# Altium footprint library Connectors THD.PcbLib: 631 footprints (part 44 of 46)
Each footprint in its own frame and in the unit in brackets; x right, y up, seen from the top. Pads: shape width x height; smd on the part's side, far side on the other; paste and mask are expansions set on the pad; w line width, h text height; cw(c..) or ccw(c..) is an arc to the next point about the centre after c.
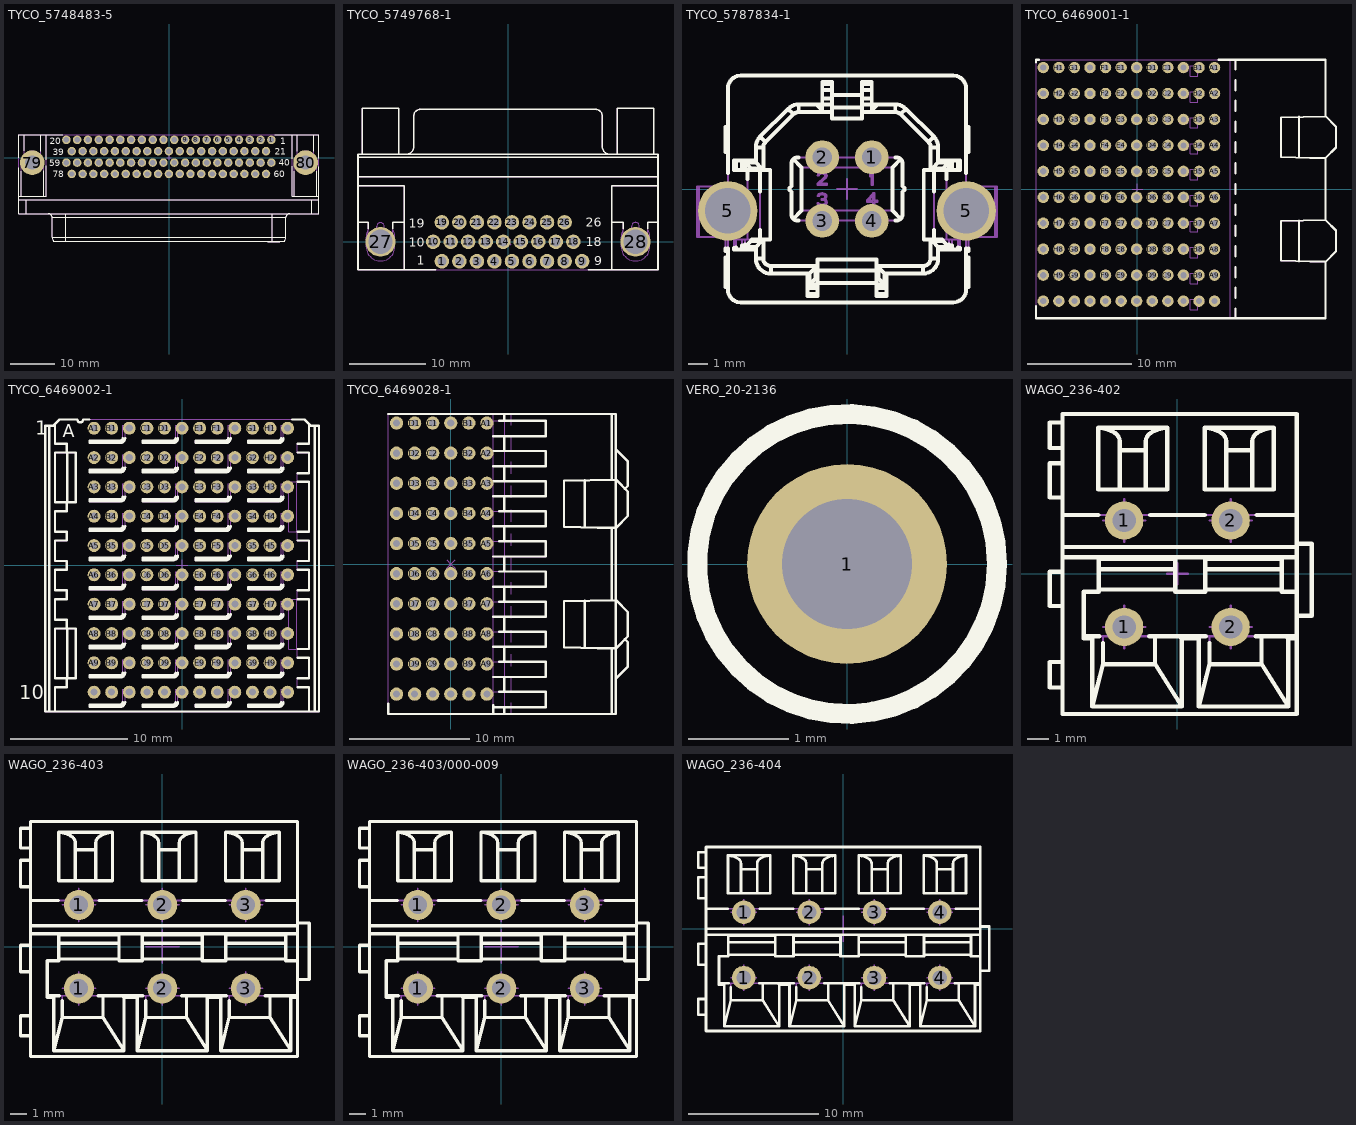
[diagram p43: the footprints below, top view; thin cyan lines are the x and y axes]

## TYCO_5748483-5 [mm] "Right Angle D-SUB 78 Female Contacts, Shell Size 5, With Boardlock and Threaded Insert,(4-40 UNC), HD-22 Serie"
height 15.55
pads (80):
  round 1.9 hole 1.2: 1(22.87,3.965) 2(20.46,3.965) 3(18.05,3.965) 4(15.64,3.965) 5(13.23,3.965) 6(10.82,3.965) 7(8.41,3.965) 8(6,3.965) 9(3.59,3.965) 10(1.18,3.965) 11(-1.23,3.965) 12(-3.64,3.965) 13(-6.05,3.965) 14(-8.46,3.965) 15(-10.87,3.965) 16(-13.28,3.965) 17(-15.69,3.965) 18(-18.1,3.965) 19(-20.51,3.965) 20(-22.92,3.965) 21(21.67,1.425) 22(19.26,1.425) 23(16.85,1.425) 24(14.44,1.425) 25(12.03,1.425) 26(9.62,1.425) 27(7.21,1.425) 28(4.8,1.425) 29(2.39,1.425) 30(-0.02,1.425) 31(-2.43,1.425) 32(-4.84,1.425) 33(-7.25,1.425) 34(-9.66,1.425) 35(-12.07,1.425) 36(-14.48,1.425) 37(-16.89,1.425) 38(-19.3,1.425) 39(-21.71,1.425) 40(22.87,-1.115) 41(20.46,-1.115) 42(18.05,-1.115) 43(15.64,-1.115) 44(13.23,-1.115) 45(10.82,-1.115) 46(8.41,-1.115) 47(6,-1.115) 48(3.59,-1.115) 49(1.18,-1.115) 50(-1.23,-1.115) 51(-3.64,-1.115) 52(-6.05,-1.115) 53(-8.46,-1.115) 54(-10.87,-1.115) 55(-13.28,-1.115) 56(-15.69,-1.115) 57(-18.1,-1.115) 58(-20.51,-1.115) 59(-22.92,-1.115) 60(21.67,-3.655) 61(19.26,-3.655) 62(16.85,-3.655) 63(14.44,-3.655) 64(12.03,-3.655) 65(9.62,-3.655) 66(7.21,-3.655) 67(4.8,-3.655) 68(2.39,-3.655) 69(-0.02,-3.655) 70(-2.43,-3.655) 71(-4.84,-3.655) 72(-7.25,-3.655) 73(-9.66,-3.655) 74(-12.07,-3.655) 75(-14.48,-3.655) 76(-16.89,-3.655) 77(-19.3,-3.655) 78(-21.71,-3.655)
  round 5.5 hole 3.2: 79(-30.55,-1.115) 80(30.5,-1.115)
Top Overlay:
  lines w0.2: -33.5,-9.405 33.5,-9.405 ; -33.5,-8.645 -27.47,-8.645 -27.47,-1.775 ; -33.5,-2.22 -33.5,-12.545 33.5,-12.545 33.5,-2.075 ; -33.5,-0.01 -33.5,5.055 -23.717,5.055 ; -33,-8.645 -33,-3.095 ; -32.325,1.487 -32.325,5.055 ; -31.925,-12.545 -31.925,-9.405 ; -28.675,1.416 -28.675,5.055 ; -28,-8.645 -28,-2.964 ; -27.47,-0.455 -27.47,5.055 ; -26.913,-12.545 cw(c-26.913,-13.358) -26.1,-13.358 ; -23.052,-18.645 -23.052,-12.545 ; 22,-18.645 22,-18.745 22.75,-18.745 22.75,-18.645 ; 22.021,-18.745 22.021,-18.645 ; 22.063,-18.745 22.063,-18.645 ; 22.125,-18.745 22.125,-18.645 ; 22.229,-18.745 22.229,-18.645 ; 22.333,-18.745 22.333,-18.645 ; 22.417,-18.745 22.417,-18.645 ; 22.521,-18.745 22.521,-18.645 ; 22.625,-18.745 22.625,-18.645 ; 22.688,-18.745 22.688,-18.645 ; 22.708,-18.745 22.708,-18.645 ; 22.8,-18.645 22.8,-18.745 23.967,-18.745 23.967,-18.645 ; 22.821,-18.745 22.821,-18.645 ; 22.842,-18.745 22.842,-18.645 ; 22.925,-18.745 22.925,-18.645 ; 23.008,-18.745 23.008,-18.645 ; 23.052,-18.645 23.052,-12.545 ; 23.154,-18.745 23.154,-18.645 ; 23.238,-18.745 23.238,-18.645 ; 23.363,-18.745 23.363,-18.645 ; 23.446,-18.745 23.446,-18.645 ; 23.529,-18.745 23.529,-18.645 ; 23.55,-18.745 23.55,-18.645 ; 23.625,-18.745 23.625,-18.645 ; 23.667,5.055 33.5,5.055 33.5,-0.155 ; 23.717,-18.745 23.717,-18.645 ; 23.842,-18.745 23.842,-18.645 ; 24,-18.645 24,-18.745 24.75,-18.745 24.75,-18.645 ; 24.021,-18.745 24.021,-18.645 ; 24.042,-18.745 24.042,-18.645 ; 24.083,-18.745 24.083,-18.645 ; 24.1,-18.745 24.1,-18.645 ; 24.225,-18.745 24.225,-18.645 ; 24.35,-18.745 24.35,-18.645 ; 24.375,-18.745 24.375,-18.645 ; 24.5,-18.745 24.5,-18.645 ; 24.604,-18.745 24.604,-18.645 ; 24.667,-18.745 24.667,-18.645 ; 24.708,-18.745 24.708,-18.645 ; 24.729,-18.745 24.729,-18.645 ; 26.913,-12.545 ccw(c26.913,-13.358) 26.1,-13.358 ; 27.47,-1.976 27.47,-8.645 33.5,-8.645 ; 27.47,-0.254 27.47,5.055 ; 28,-8.645 28,-3.031 ; 28.675,1.452 28.675,5.055 ; 31.925,-12.545 31.925,-9.405 ; 32.325,1.452 32.325,5.055 ; 33,-8.645 33,-3.031 ; -26.1,-17.82 ccw(c-24.83,-17.82) -25.795,-18.645 25.795,-18.645 ccw(c24.83,-17.82) 26.1,-17.82 ; -26.1,-17.82 -26.1,-13.358 ; -26.1,-17.82 26.1,-17.82 ; -26.1,-13.358 26.1,-13.358 ; 26.1,-17.82 26.1,-13.358
  text "60" at 23.446,-4.402 h1.5
  text "40" at 24.471,-1.827 h1.5
  text "21" at 23.596,0.623 h1.5
  text "59" at -26.733,-1.94 h1.5
  text "39" at -25.979,0.56 h1.5
  text "1" at 24.846,2.963 h1.5
  text "78" at -25.954,-4.44 h1.5
  text "20" at -26.629,2.923 h1.5
Mechanical 8:
  drawing of 168 lines, arcs and shapes, not listed
Mechanical 14:
  lines w0.1: -33.5,-9.405 33.5,-9.405 ; -33.5,-8.645 -27.47,-8.645 -27.47,5.055 ; -33,-8.645 -33,-1.115 -31.5,-1.115 -31.5,-0.815 ; -32.325,-1.115 -32.325,5.055 ; -32.325,-0.39 cw(c-30.5,-0.39) -28.675,-0.39 ; -32.155,-1.115 -32.155,-0.815 -30.775,-0.815 -30.775,-1.115 -30.225,-1.115 -30.225,-0.815 -28.845,-0.815 -28.845,-1.115 ; -31.925,-12.545 -31.925,-9.405 ; -31.764,-1.115 -31.764,-0.815 ; -31.68,-1.115 -31.68,-0.815 ; -29.5,-0.815 -29.5,-1.115 -28,-1.115 -28,-8.645 ; -29.32,-1.115 -29.32,-0.815 ; -29.236,-1.115 -29.236,-0.815 ; -28.675,-1.115 -28.675,5.055 ; -26.913,-12.545 cw(c-26.913,-13.358) -26.1,-13.358 ; -23.052,-18.645 -23.052,-12.545 ; 22,-18.645 22,-18.745 22.75,-18.745 22.75,-18.645 ; 22.021,-18.745 22.021,-18.645 ; 22.063,-18.745 22.063,-18.645 ; 22.125,-18.745 22.125,-18.645 ; 22.229,-18.745 22.229,-18.645 ; 22.333,-18.745 22.333,-18.645 ; 22.417,-18.745 22.417,-18.645 ; 22.521,-18.745 22.521,-18.645 ; 22.625,-18.745 22.625,-18.645 ; 22.688,-18.745 22.688,-18.645 ; 22.708,-18.745 22.708,-18.645 ; 22.8,-18.645 22.8,-18.745 23.967,-18.745 23.967,-18.645 ; 22.821,-18.745 22.821,-18.645 ; 22.842,-18.745 22.842,-18.645 ; 22.925,-18.745 22.925,-18.645 ; 23.008,-18.745 23.008,-18.645 ; 23.052,-18.645 23.052,-12.545 ; 23.154,-18.745 23.154,-18.645 ; 23.238,-18.745 23.238,-18.645 ; 23.363,-18.745 23.363,-18.645 ; 23.446,-18.745 23.446,-18.645 ; 23.529,-18.745 23.529,-18.645 ; 23.55,-18.745 23.55,-18.645 ; 23.625,-18.745 23.625,-18.645 ; 23.717,-18.745 23.717,-18.645 ; 23.842,-18.745 23.842,-18.645 ; 24,-18.645 24,-18.745 24.75,-18.745 24.75,-18.645 ; 24.021,-18.745 24.021,-18.645 ; 24.042,-18.745 24.042,-18.645 ; 24.083,-18.745 24.083,-18.645 ; 24.1,-18.745 24.1,-18.645 ; 24.225,-18.745 24.225,-18.645 ; 24.35,-18.745 24.35,-18.645 ; 24.375,-18.745 24.375,-18.645 ; 24.5,-18.745 24.5,-18.645 ; 24.604,-18.745 24.604,-18.645 ; 24.667,-18.745 24.667,-18.645 ; 24.708,-18.745 24.708,-18.645 ; 24.729,-18.745 24.729,-18.645 ; 26.913,-12.545 ccw(c26.913,-13.358) 26.1,-13.358 ; 27.47,5.055 27.47,-8.645 33.5,-8.645 ; 28,-8.645 28,-1.115 29.5,-1.115 29.5,-0.815 ; 28.675,-1.115 28.675,5.055 ; 28.675,-0.39 cw(c30.5,-0.39) 32.325,-0.39 ; 28.845,-1.115 28.845,-0.815 30.225,-0.815 30.225,-1.115 30.775,-1.115 30.775,-0.815 32.155,-0.815 32.155,-1.115 ; 29.236,-1.115 29.236,-0.815 ; 29.32,-1.115 29.32,-0.815 ; 31.5,-0.815 31.5,-1.115 33,-1.115 33,-8.645 ; 31.68,-1.115 31.68,-0.815 ; 31.764,-1.115 31.764,-0.815 ; 31.925,-12.545 31.925,-9.405 ; 32.325,-1.115 32.325,5.055 ; -26.1,-17.82 ccw(c-24.83,-17.82) -25.795,-18.645 25.795,-18.645 ccw(c24.83,-17.82) 26.1,-17.82 ; -26.1,-17.82 -26.1,-13.358 ; -26.1,-17.82 26.1,-17.82 ; -26.1,-13.358 26.1,-13.358 ; 26.1,-17.82 26.1,-13.358 ; -33.5,-12.545 -33.5,5.055 33.5,5.055 33.5,-12.545 -33.5,-12.545
  text "60" at 23.446,-4.402 h1.5
  text "40" at 24.471,-1.827 h1.5
  text "21" at 23.596,0.623 h1.5
  text "59" at -26.733,-1.94 h1.5
  text "39" at -25.979,0.56 h1.5
  text "1" at 24.846,2.963 h1.5
  text "78" at -25.954,-4.44 h1.5
  text "20" at -26.629,2.923 h1.5
3D body: height 15.3, standoff -3.5, extent -33.5,-18.745 33.5,5.055

## TYCO_5749768-1 [mm] "26 Female Contacts, Right Angle High Density D-SUB Connector With Boardlock and 4-40 UNC Female Screwlocks, AMPLIMITE HD-22 Serie"
height 12.75
pads (28):
  round 1.9 hole 1.2: 1(-8.64,-2.54) 2(-6.35,-2.54) 3(-4.06,-2.54) 4(-1.77,-2.54) 5(0.52,-2.54) 6(2.81,-2.54) 7(5.1,-2.54) 8(7.39,-2.54) 9(9.68,-2.54) 10(-9.78,0) 11(-7.49,0) 12(-5.2,0) 13(-2.91,0) 14(-0.62,0) 15(1.67,0) 16(3.96,0) 17(6.25,0) 18(8.54,0) 19(-8.64,2.54) 20(-6.35,2.54) 21(-4.06,2.54) 22(-1.77,2.54) 23(0.52,2.54) 24(2.81,2.54) 25(5.1,2.54) 26(7.39,2.54)
  round 3.9 hole 3.2: 27(-16.66,0) 28(16.66,0)
Top Overlay:
  lines w0.2: -19.6,2.53 -18.285,2.53 -18.285,1.698 ; -19.6,7.33 -13.55,7.33 -13.55,-3.63 ; -19.6,8.53 19.6,8.53 ; -19.6,11.03 19.6,11.03 ; -19.06,11.43 -19.06,17.43 -14.26,17.43 -14.26,11.43 ; -15.035,1.698 -15.035,2.53 -13.55,2.53 ; -13.32,11.43 ccw(c-13.32,12.43) -12.32,12.43 -12.32,16.45 cw(c-11.47,16.45) -11.47,17.3 11.47,17.3 cw(c11.47,16.45) 12.32,16.45 12.32,12.43 ccw(c13.32,12.43) 13.32,11.43 ; -9.436,-3.63 -19.6,-3.63 -19.6,11.43 19.6,11.43 19.6,-3.63 10.476,-3.63 ; 13.55,-3.63 13.55,7.33 19.6,7.33 ; 13.55,2.53 15.035,2.53 15.035,1.698 ; 14.26,11.43 14.26,17.43 19.06,17.43 19.06,11.43 ; 18.285,1.698 18.285,2.53 19.6,2.53
  text "1" at -11.95,-3 h1.2
  text "19" at -12.95,1.865 h1.2
  text "10" at -12.95,-0.675 h1.2
  text "18" at 10.175,-0.6 h1.2
  text "26" at 10.175,1.94 h1.2
  text "9" at 11.25,-3.04 h1.2
Mechanical 8:
  lines w0.1: -17.16,0 -16.66,0 ; -16.66,-0.5 -16.66,0 ; -16.66,0.5 -16.66,0 ; -16.16,0 -16.66,0 ; -10.28,0 -9.78,0 ; -9.78,-0.5 -9.78,0 ; -9.78,0.5 -9.78,0 ; -9.28,0 -9.78,0 ; -9.14,-2.54 -8.64,-2.54 ; -9.14,2.54 -8.64,2.54 ; -8.64,-3.04 -8.64,-2.54 ; -8.64,-2.04 -8.64,-2.54 ; -8.64,2.04 -8.64,2.54 ; -8.64,3.04 -8.64,2.54 ; -8.14,-2.54 -8.64,-2.54 ; -8.14,2.54 -8.64,2.54 ; -7.99,0 -7.49,0 ; -7.49,-0.5 -7.49,0 ; -7.49,0.5 -7.49,0 ; -6.99,0 -7.49,0 ; -6.85,-2.54 -6.35,-2.54 ; -6.85,2.54 -6.35,2.54 ; -6.35,-3.04 -6.35,-2.54 ; -6.35,-2.04 -6.35,-2.54 ; -6.35,2.04 -6.35,2.54 ; -6.35,3.04 -6.35,2.54 ; -5.85,-2.54 -6.35,-2.54 ; -5.85,2.54 -6.35,2.54 ; -5.7,0 -5.2,0 ; -5.2,-0.5 -5.2,0 ; -5.2,0.5 -5.2,0 ; -4.7,0 -5.2,0 ; -4.56,-2.54 -4.06,-2.54 ; -4.56,2.54 -4.06,2.54 ; -4.06,-3.04 -4.06,-2.54 ; -4.06,-2.04 -4.06,-2.54 ; -4.06,2.04 -4.06,2.54 ; -4.06,3.04 -4.06,2.54 ; -3.56,-2.54 -4.06,-2.54 ; -3.56,2.54 -4.06,2.54 ; -3.41,0 -2.91,0 ; -2.91,-0.5 -2.91,0 ; -2.91,0.5 -2.91,0 ; -2.41,0 -2.91,0 ; -2.27,-2.54 -1.77,-2.54 ; -2.27,2.54 -1.77,2.54 ; -1.77,-3.04 -1.77,-2.54 ; -1.77,-2.04 -1.77,-2.54 ; -1.77,2.04 -1.77,2.54 ; -1.77,3.04 -1.77,2.54 ; -1.27,-2.54 -1.77,-2.54 ; -1.27,2.54 -1.77,2.54 ; -1.12,0 -0.62,0 ; -0.62,-0.5 -0.62,0 ; -0.62,0.5 -0.62,0 ; -0.354,-0.354 0,0 ; -0.354,0.354 0,0 ; 0.02,-2.54 0.52,-2.54 ; 0.02,2.54 0.52,2.54 ; 0.354,-0.354 0,0 ; 0.354,0.354 0,0 ; 0.52,-3.04 0.52,-2.54 ; 0.52,-2.04 0.52,-2.54 ; 0.52,2.04 0.52,2.54 ; 0.52,3.04 0.52,2.54 ; 1.02,-2.54 0.52,-2.54 ; 1.02,2.54 0.52,2.54 ; 1.17,0 1.67,0 ; 1.67,-0.5 1.67,0 ; 1.67,0.5 1.67,0 ; 2.17,0 1.67,0 ; 2.31,-2.54 2.81,-2.54 ; 2.31,2.54 2.81,2.54 ; 2.81,-3.04 2.81,-2.54 ; 2.81,-2.04 2.81,-2.54 ; 2.81,2.04 2.81,2.54 ; 2.81,3.04 2.81,2.54 ; 3.31,-2.54 2.81,-2.54 ; 3.31,2.54 2.81,2.54 ; 3.46,0 3.96,0 ; 3.96,-0.5 3.96,0 ; 3.96,0.5 3.96,0 ; 4.46,0 3.96,0 ; 4.6,-2.54 5.1,-2.54 ; 4.6,2.54 5.1,2.54 ; 5.1,-3.04 5.1,-2.54 ; 5.1,-2.04 5.1,-2.54 ; 5.1,2.04 5.1,2.54 ; 5.1,3.04 5.1,2.54 ; 5.6,-2.54 5.1,-2.54 ; 5.6,2.54 5.1,2.54 ; 5.75,0 6.25,0 ; 6.25,-0.5 6.25,0 ; 6.25,0.5 6.25,0 ; 6.75,0 6.25,0 ; 6.89,-2.54 7.39,-2.54 ; 6.89,2.54 7.39,2.54 ; 7.39,-3.04 7.39,-2.54 ; 7.39,-2.04 7.39,-2.54 ; 7.39,2.04 7.39,2.54 ; 7.39,3.04 7.39,2.54 ; 7.89,-2.54 7.39,-2.54 ; 7.89,2.54 7.39,2.54 ; 8.04,0 8.54,0 ; 8.54,-0.5 8.54,0 ; 8.54,0.5 8.54,0 ; 9.04,0 8.54,0 ; 9.18,-2.54 9.68,-2.54 ; 9.68,-3.04 9.68,-2.54 ; 9.68,-2.04 9.68,-2.54 ; 10.18,-2.54 9.68,-2.54 ; 16.16,0 16.66,0 ; 16.66,-0.5 16.66,0 ; 16.66,0.5 16.66,0 ; 17.16,0 16.66,0
Mechanical 14:
  lines w0.1: -19.6,2.53 -18.285,2.53 -18.285,-0.3 ; -19.6,7.33 -13.55,7.33 -13.55,-3.63 ; -19.6,8.53 19.6,8.53 ; -19.6,11.03 19.6,11.03 ; -19.06,11.43 -19.06,17.43 -14.26,17.43 -14.26,11.43 ; -18.285,0.3 -18.535,0.3 -18.535,0.625 cw(c-16.66,0.625) -18.285,1.56 ; -17.16,2.03 -17.16,-0.3 -18.285,-0.3 ; -17.154,1.951 cw(c-16.658,2.001) -16.16,2.03 -16.16,-0.3 -15.035,-0.3 ; -15.035,0.3 -14.785,0.3 -14.785,0.625 ccw(c-16.66,0.625) -15.035,1.56 ; -13.55,2.53 -15.035,2.53 -15.035,-0.3 ; -13.32,11.43 ccw(c-13.32,12.43) -12.32,12.43 -12.32,16.45 cw(c-11.47,16.45) -11.47,17.3 11.47,17.3 cw(c11.47,16.45) 12.32,16.45 12.32,12.43 ccw(c13.32,12.43) 13.32,11.43 ; 13.55,-3.63 13.55,7.33 19.6,7.33 ; 13.55,2.53 15.035,2.53 15.035,-0.3 ; 14.26,11.43 14.26,17.43 19.06,17.43 19.06,11.43 ; 15.035,0.3 14.785,0.3 14.785,0.625 cw(c16.66,0.625) 15.035,1.56 ; 18.285,0.3 18.535,0.3 18.535,0.625 ccw(c16.66,0.625) 18.285,1.56 ; 19.6,2.53 18.285,2.53 18.285,-0.3 ; -18.285,-0.3 -18.535,-0.3 -18.535,-0.625 ccw(c-16.66,-0.625) -14.785,-0.625 -14.785,-0.3 -15.035,-0.3 ; 15.035,-0.3 14.785,-0.3 14.785,-0.625 ccw(c16.66,-0.625) 18.535,-0.625 18.535,-0.3 18.285,-0.3 ; 15.035,-0.3 16.16,-0.3 16.16,2.03 cw(c16.66,2.03) 17.16,2.03 17.16,-0.3 18.285,-0.3 ; -19.6,-3.63 -19.6,11.43 19.6,11.43 19.6,-3.63 -19.6,-3.63
3D body: height 12.5, standoff -4.35, extent -19.6,-3.63 19.6,17.43

## TYCO_5787834-1 [mm] "4 Position, Straight USB Type B Receptacle"
height 15.62
pads (6):
  round 1.7 hole 1: 1(1.25,1.605) 2(-1.25,1.605) 3(-1.25,-1.605) 4(1.25,-1.605)
  round 3 hole 2.3: 5(-6.02,-1.1) 5(6.02,-1.1)
Top Overlay:
  drawing of 188 lines, arcs and shapes, not listed
Mechanical 8:
  lines w0.1: -6.52,-1.1 -6.02,-1.1 ; -6.02,-1.6 -6.02,-1.1 ; -6.02,-0.6 -6.02,-1.1 ; -5.52,-1.1 -6.02,-1.1 ; -1.75,-1.605 -1.25,-1.605 ; -1.75,1.605 -1.25,1.605 ; -1.25,-2.105 -1.25,-1.605 ; -1.25,-1.105 -1.25,-1.605 ; -1.25,1.105 -1.25,1.605 ; -1.25,2.105 -1.25,1.605 ; -0.75,-1.605 -1.25,-1.605 ; -0.75,1.605 -1.25,1.605 ; -0.5,0 0,0 ; 0,-0.5 0,0 ; 0,0.5 0,0 ; 0.5,0 0,0 ; 0.75,-1.605 1.25,-1.605 ; 0.75,1.605 1.25,1.605 ; 1.25,-2.105 1.25,-1.605 ; 1.25,-1.105 1.25,-1.605 ; 1.25,1.105 1.25,1.605 ; 1.25,2.105 1.25,1.605 ; 1.75,-1.605 1.25,-1.605 ; 1.75,1.605 1.25,1.605 ; 5.52,-1.1 6.02,-1.1 ; 6.02,-1.6 6.02,-1.1 ; 6.02,-0.6 6.02,-1.1 ; 6.52,-1.1 6.02,-1.1
Mechanical 14:
  drawing of 314 lines, arcs and shapes, not listed
3D body: height 15.62, standoff -4.02, extent -7.571,-5.723 7.572,5.733

## TYCO_6469001-1 [mm] "80 Positions, Pitch 2.5mm,  Advanced TCA, Z-PACK HM-Zd Right Angle Press Fit Receptacle"
height 15.72
pads (120):
  round 1.1 hole 0.6: A1(7.435,11.7) A2(7.435,9.2) A3(7.435,6.7) A4(7.435,4.2) A5(7.435,1.7) A6(7.435,-0.8) A7(7.435,-3.3) A8(7.435,-5.8) A9(7.435,-8.3) A10(7.435,-10.8) B1(5.935,11.7) B2(5.935,9.2) B3(5.935,6.7) B4(5.935,4.2) B5(5.935,1.7) B6(5.935,-0.8) B7(5.935,-3.3) B8(5.935,-5.8) B9(5.935,-8.3) B10(5.935,-10.8) BG1(4.435,11.7) BG2(4.435,9.2) BG3(4.435,6.7) BG4(4.435,4.2) BG5(4.435,1.7) BG6(4.435,-0.8) BG7(4.435,-3.3) BG8(4.435,-5.8) BG9(4.435,-8.3) BG10(4.435,-10.8) C1(2.935,11.7) C2(2.935,9.2) C3(2.935,6.7) C4(2.935,4.2) C5(2.935,1.7) C6(2.935,-0.8) C7(2.935,-3.3) C8(2.935,-5.8) C9(2.935,-8.3) C10(2.935,-10.8) D1(1.435,11.7) D2(1.435,9.2) D3(1.435,6.7) D4(1.435,4.2) D5(1.435,1.7) D6(1.435,-0.8) D7(1.435,-3.3) D8(1.435,-5.8) D9(1.435,-8.3) D10(1.435,-10.8) DG1(-0.065,11.7) DG2(-0.065,9.2) DG3(-0.065,6.7) DG4(-0.065,4.2) DG5(-0.065,1.7) DG6(-0.065,-0.8) DG7(-0.065,-3.3) DG8(-0.065,-5.8) DG9(-0.065,-8.3) DG10(-0.065,-10.8) E1(-1.565,11.7) E2(-1.565,9.2) E3(-1.565,6.7) E4(-1.565,4.2) E5(-1.565,1.7) E6(-1.565,-0.8) E7(-1.565,-3.3) E8(-1.565,-5.8) E9(-1.565,-8.3) E10(-1.565,-10.8) F1(-3.065,11.7) F2(-3.065,9.2) F3(-3.065,6.7) F4(-3.065,4.2) F5(-3.065,1.7) F6(-3.065,-0.8) F7(-3.065,-3.3) F8(-3.065,-5.8) F9(-3.065,-8.3) F10(-3.065,-10.8) FG1(-4.565,11.7) FG2(-4.565,9.2) FG3(-4.565,6.7) FG4(-4.565,4.2) FG5(-4.565,1.7) FG6(-4.565,-0.8) FG7(-4.565,-3.3) FG8(-4.565,-5.8) FG9(-4.565,-8.3) FG10(-4.565,-10.8) G1(-6.065,11.7) G2(-6.065,9.2) G3(-6.065,6.7) G4(-6.065,4.2) G5(-6.065,1.7) G6(-6.065,-0.8) G7(-6.065,-3.3) G8(-6.065,-5.8) G9(-6.065,-8.3) G10(-6.065,-10.8) H1(-7.565,11.7) H2(-7.565,9.2) H3(-7.565,6.7) H4(-7.565,4.2) H5(-7.565,1.7) H6(-7.565,-0.8) H7(-7.565,-3.3) H8(-7.565,-5.8) H9(-7.565,-8.3) H10(-7.565,-10.8) HG1(-9.065,11.7) HG2(-9.065,9.2) HG3(-9.065,6.7) HG4(-9.065,4.2) HG5(-9.065,1.7) HG6(-9.065,-0.8) HG7(-9.065,-3.3) HG8(-9.065,-5.8) HG9(-9.065,-8.3) HG10(-9.065,-10.8)
Top Overlay:
  lines w0.2: -9.765,-11.282 -9.765,-12.45 18.135,-12.45 18.135,-7 ; -9.765,12.182 -9.765,12.45 -9.465,12.45 ; 7.835,12.45 18.135,12.45 18.135,7 ; 9.435,-12.45 9.435,-11.5 ; 9.435,-10.5 9.435,-9.5 ; 9.435,-8.5 9.435,-7.5 ; 9.435,-6.5 9.435,-5.5 ; 9.435,-4.5 9.435,-3.5 ; 9.435,-2.5 9.435,-1.5 ; 9.435,-0.5 9.435,0.5 ; 9.435,1.5 9.435,2.5 ; 9.435,3.5 9.435,4.5 ; 9.435,5.5 9.435,6.5 ; 9.435,7.5 9.435,8.5 ; 9.435,9.5 9.435,10.5 ; 9.435,11.5 9.435,12.45 ; 15.565,-6.963 15.565,-3.037 ; 15.565,3.037 15.565,6.963 ; 18.135,-7 19.135,-6 19.135,-4 18.135,-3 ; 18.135,-7 16.635,-7 13.835,-6.903 13.835,-3.097 18.135,-3 ; 18.135,-3 18.135,3 ; 18.135,3 19.135,4 19.135,6 18.135,7 ; 18.135,3 16.635,3 13.835,3.097 13.835,6.903 18.135,7
Mechanical 8:
  drawing of 486 lines, arcs and shapes, not listed
  text "PCB Edge" at 10.3,-3.5 h1
Mechanical 14:
  lines w0.1: 9.435,-12.45 9.435,-11.5 ; 9.435,-10.5 9.435,-9.5 ; 9.435,-8.5 9.435,-7.5 ; 9.435,-6.5 9.435,-5.5 ; 9.435,-4.5 9.435,-3.5 ; 9.435,-2.5 9.435,-1.5 ; 9.435,-0.5 9.435,0.5 ; 9.435,1.5 9.435,2.5 ; 9.435,3.5 9.435,4.5 ; 9.435,5.5 9.435,6.5 ; 9.435,7.5 9.435,8.5 ; 9.435,9.5 9.435,10.5 ; 9.435,11.5 9.435,12.45 ; 15.565,-6.963 15.565,-3.037 ; 15.565,3.037 15.565,6.963 ; 18.135,-7 18.135,-12.45 -9.765,-12.45 -9.765,12.45 18.135,12.45 18.135,7 ; 18.135,-7 19.135,-6 19.135,-4 18.135,-3 ; 18.135,-7 16.635,-7 13.835,-6.903 13.835,-3.097 18.135,-3 ; 18.135,-3 18.135,3 ; 18.135,3 19.135,4 19.135,6 18.135,7 ; 18.135,3 16.635,3 13.835,3.097 13.835,6.903 18.135,7 ; 5.115,-11.62 5.835,-11.62 5.835,-10.62 5.115,-10.62 5.115,-11.62 ; 5.115,-9.12 5.835,-9.12 5.835,-8.12 5.115,-8.12 5.115,-9.12 ; 5.115,-6.62 5.835,-6.62 5.835,-5.62 5.115,-5.62 5.115,-6.62 ; 5.115,-4.12 5.835,-4.12 5.835,-3.12 5.115,-3.12 5.115,-4.12 ; 5.115,-1.62 5.835,-1.62 5.835,-0.62 5.115,-0.62 5.115,-1.62 ; 5.115,0.88 5.835,0.88 5.835,1.88 5.115,1.88 5.115,0.88 ; 5.115,3.38 5.835,3.38 5.835,4.38 5.115,4.38 5.115,3.38 ; 5.115,5.88 5.835,5.88 5.835,6.88 5.115,6.88 5.115,5.88 ; 5.115,8.38 5.835,8.38 5.835,9.38 5.115,9.38 5.115,8.38 ; 5.115,10.88 5.835,10.88 5.835,11.88 5.115,11.88 5.115,10.88
Drill Drawing:
  lines w0.1: -9.75,-11.55 -9.75,12.45 8.25,12.45 8.25,-11.55 -9.75,-11.55
  text "PRESS-FIT TECHNOLOGY" at 9.7,-8.3 h1
  text "diam. 0.6mm +0.06 -0" at 11.2,-9.3 h1
3D body: height 16.67, standoff -4.68, extent -9.765,-12.45 19.135,12.45

## TYCO_6469002-1 [mm] "80 Positions, Pitch 2.5mm,  Advanced TCA, Z-PACK HM-Zd BackPlane Press Fit Header"
height 13.48
pads (120):
  round 1.1 hole 0.6: A1(-7.5,11.7) A2(-7.5,9.2) A3(-7.5,6.7) A4(-7.5,4.2) A5(-7.5,1.7) A6(-7.5,-0.8) A7(-7.5,-3.3) A8(-7.5,-5.8) A9(-7.5,-8.3) A10(-7.5,-10.8) B1(-6,11.7) B2(-6,9.2) B3(-6,6.7) B4(-6,4.2) B5(-6,1.7) B6(-6,-0.8) B7(-6,-3.3) B8(-6,-5.8) B9(-6,-8.3) B10(-6,-10.8) BG1(-4.5,11.7) BG2(-4.5,9.2) BG3(-4.5,6.7) BG4(-4.5,4.2) BG5(-4.5,1.7) BG6(-4.5,-0.8) BG7(-4.5,-3.3) BG8(-4.5,-5.8) BG9(-4.5,-8.3) BG10(-4.5,-10.8) C1(-3,11.7) C2(-3,9.2) C3(-3,6.7) C4(-3,4.2) C5(-3,1.7) C6(-3,-0.8) C7(-3,-3.3) C8(-3,-5.8) C9(-3,-8.3) C10(-3,-10.8) D1(-1.5,11.7) D2(-1.5,9.2) D3(-1.5,6.7) D4(-1.5,4.2) D5(-1.5,1.7) D6(-1.5,-0.8) D7(-1.5,-3.3) D8(-1.5,-5.8) D9(-1.5,-8.3) D10(-1.5,-10.8) DG1(0,11.7) DG2(0,9.2) DG3(0,6.7) DG4(0,4.2) DG5(0,1.7) DG6(0,-0.8) DG7(0,-3.3) DG8(0,-5.8) DG9(0,-8.3) DG10(0,-10.8) E1(1.5,11.7) E2(1.5,9.2) E3(1.5,6.7) E4(1.5,4.2) E5(1.5,1.7) E6(1.5,-0.8) E7(1.5,-3.3) E8(1.5,-5.8) E9(1.5,-8.3) E10(1.5,-10.8) F1(3,11.7) F2(3,9.2) F3(3,6.7) F4(3,4.2) F5(3,1.7) F6(3,-0.8) F7(3,-3.3) F8(3,-5.8) F9(3,-8.3) F10(3,-10.8) FG1(4.5,11.7) FG2(4.5,9.2) FG3(4.5,6.7) FG4(4.5,4.2) FG5(4.5,1.7) FG6(4.5,-0.8) FG7(4.5,-3.3) FG8(4.5,-5.8) FG9(4.5,-8.3) FG10(4.5,-10.8) G1(6,11.7) G2(6,9.2) G3(6,6.7) G4(6,4.2) G5(6,1.7) G6(6,-0.8) G7(6,-3.3) G8(6,-5.8) G9(6,-8.3) G10(6,-10.8) H1(7.5,11.7) H2(7.5,9.2) H3(7.5,6.7) H4(7.5,4.2) H5(7.5,1.7) H6(7.5,-0.8) H7(7.5,-3.3) H8(7.5,-5.8) H9(7.5,-8.3) H10(7.5,-10.8) HG1(9,11.7) HG2(9,9.2) HG3(9,6.7) HG4(9,4.2) HG5(9,1.7) HG6(9,-0.8) HG7(9,-3.3) HG8(9,-5.8) HG9(9,-8.3) HG10(9,-10.8)
Top Overlay:
  drawing of 268 lines, arcs and shapes, not listed
  text "10" at -13.9,-11.4 h1.2
  text "1" at -12.5,11.125 h1.2
  text "A" at -10.15,10.925 h1.1
Mechanical 8:
  drawing of 484 lines, arcs and shapes, not listed
Mechanical 14:
  drawing of 717 lines, arcs and shapes, not listed
Drill Drawing:
  lines w0.1: -8.25,-11.55 9.75,-11.55 9.75,12.45 -8.25,12.45 -8.25,-11.55
  text "diam. 0.6mm +0.06 -0" at 11.1,-9.2 h1
  text "PRESS-FIT TECHNOLOGY" at -8.8,-8.1 h1
3D body: height 13.4, standoff -2.5, extent -11.675,-12.45 11.675,12.45
